# Altium footprint library Pi.PcbLib: 61 footprints (part 4 of 4)
Each footprint in its own frame and in the unit in brackets; x right, y up, seen from the top. Pads: shape width x height; smd on the part's side, far side on the other; paste and mask are expansions set on the pad; w line width, h text height; cw(c..) or ccw(c..) is an arc to the next point about the centre after c.
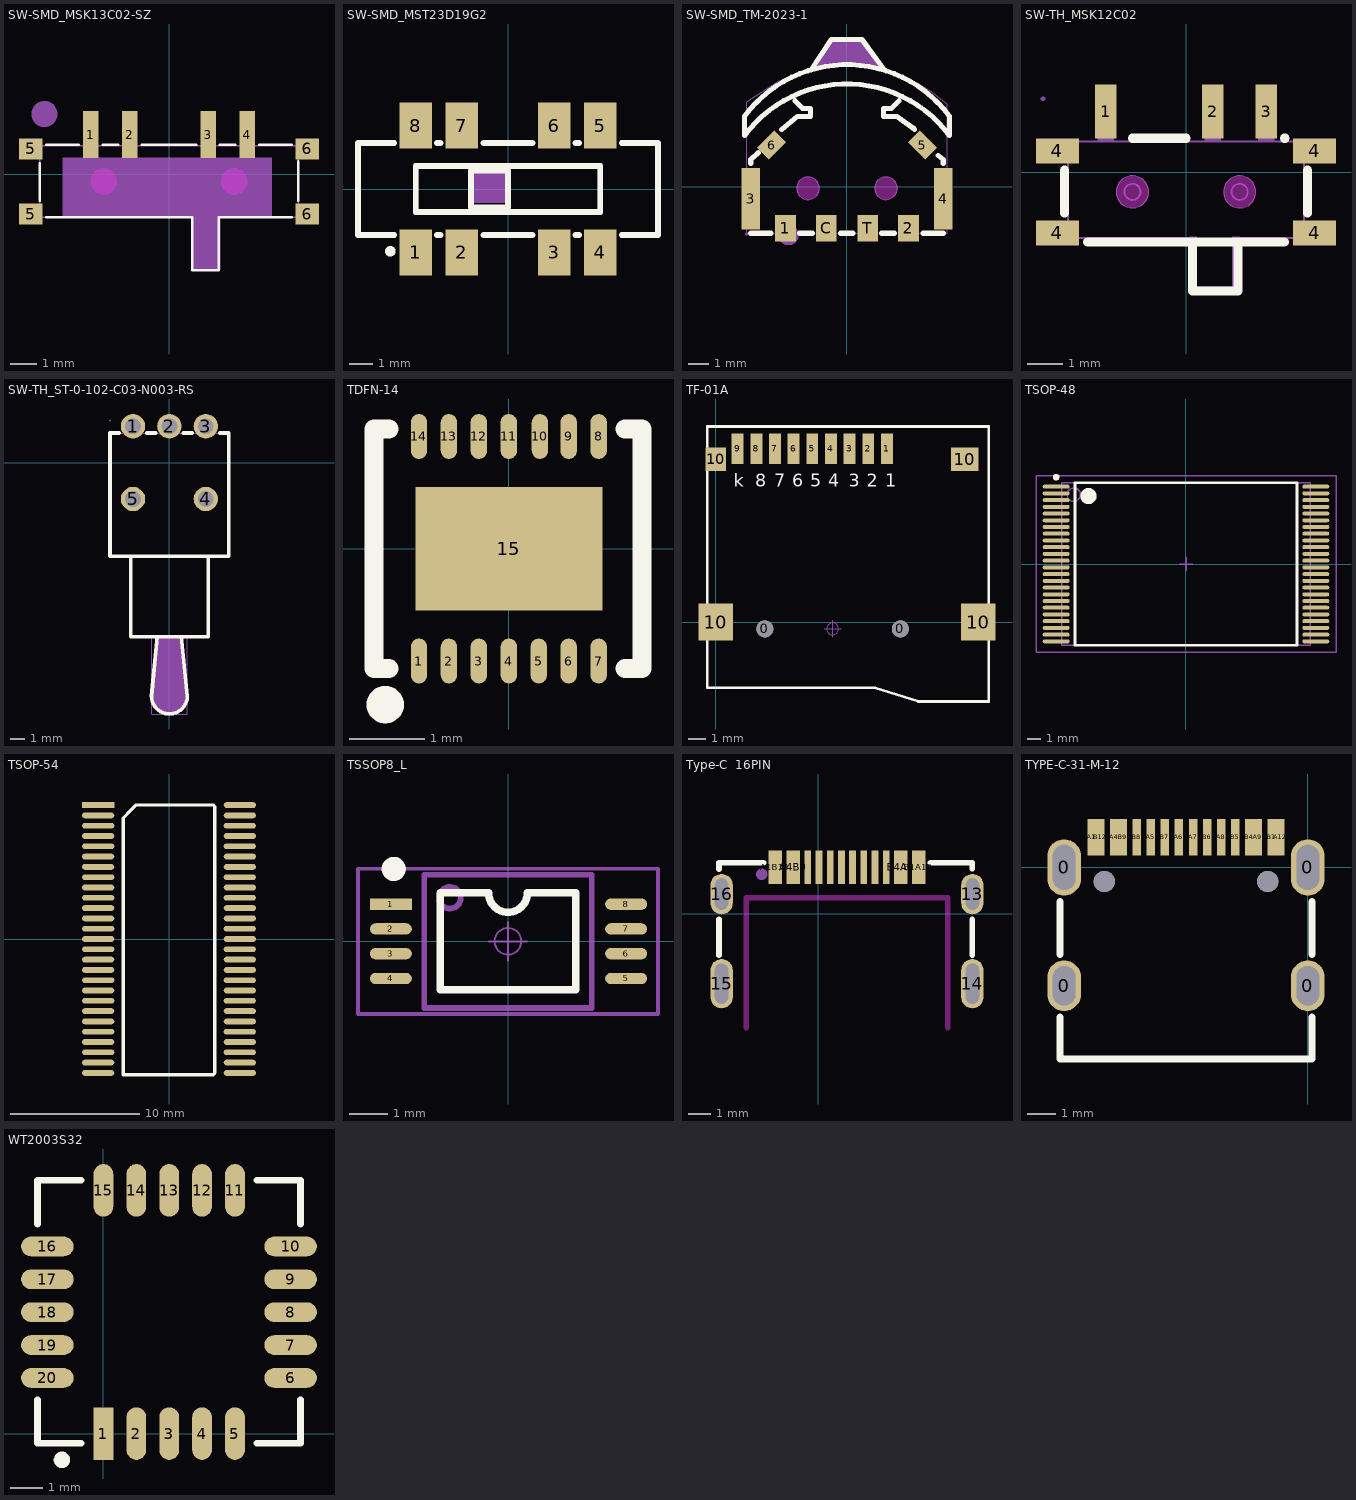
[diagram p3: the footprints below, top view; thin cyan lines are the x and y axes]

## SW-SMD_MSK13C02-SZ [mil]
pads (8):
  rect 23.6x70.9 smd mask+2: 1(-118.1,60.1) 2(-59.1,60.1) 3(59.1,60.1) 4(118.1,60.1)
  rect 35.4x31.5 smd mask+2: 5(-208.7,-60.1) 5(-208.7,38.4) 6(208.7,-60.1) 6(208.7,38.4)
Top Overlay:
  lines w3.9: -195,-40 -195,16.6 ; -184.9,-64.9 -184.9,-65 35,-65 35,-145 75,-145 75,-65 184.9,-65 ; -184.9,45 -136,45 ; -100.2,45 -76.9,45 ; -41.2,45 41.2,45 ; 76.9,45 100.2,45 ; 136,45 184.9,45 ; 195,-40 195,20
Keep-Out Layer:
  board cut-out: -78.7,-10.8 -78.7,-6.88 -81.7,0.36 -87.24,5.9 -94.48,8.9 -102.32,8.9 -109.56,5.9 -115.1,0.36 -118.1,-6.88 -118.1,-10.8 -118.1,-14.72 -115.1,-21.96 -109.56,-27.5 -102.32,-30.5 -94.48,-30.5 -87.24,-27.5 -81.7,-21.96 -78.7,-14.72
  board cut-out: 118.1,-10.8 118.1,-6.88 115.1,0.36 109.56,5.9 102.32,8.9 94.48,8.9 87.24,5.9 81.7,0.36 78.7,-6.88 78.7,-10.8 78.7,-14.72 81.7,-21.96 87.24,-27.5 94.48,-30.5 102.32,-30.5 109.56,-27.5 115.1,-21.96 118.1,-14.72
Mechanical 1:
  circle w0.2: c-98.4,-10.8 r19.7
  circle w0.2: c98.4,-10.8 r19.7
Mechanical 6:
  circle w19.7: c-188,91 r9.8
  region: 35,-145 35,-65 75,-65 75,-145
  region: -160,-65 -160,25 155,25 155,-65 150,-65
Mechanical 15:
  region: -126,84.5 -110.2,84.5 -110.2,33.3 -126,33.3
  region: -66.9,84.5 -51.2,84.5 -51.2,33.3 -66.9,33.3
  region: 51.2,84.5 66.9,84.5 66.9,33.3 51.2,33.3
  region: 110.2,84.5 126,84.5 126,33.3 110.2,33.3
  region: -213.9,43.4 -194.2,43.4 -194.2,27.7 -213.9,27.7
  region: 194.1,42.7 213.8,42.7 213.8,27 194.1,27
  region: 194.2,-48.2 213.9,-48.2 213.9,-64 194.2,-64
  region: -213.9,-48.2 -194.2,-48.2 -194.2,-64 -213.9,-64
  lines w2: -194.9,-65.1 37.1,-65.1 37.1,-143.9 76.7,-143.9 76.7,-65 194.9,-65 194.9,43.4 -194.9,43.4 -194.9,-65.1
3D body "MSK13C02.STEP": height 59.04, standoff -19.7, extent -213.58,-142.35 213.58,86

## SW-SMD_MST23D19G2 [mm]
pads (8):
  rect 1.4x2 smd: 1(-4,-2.75) 2(-2,-2.75) 3(2,-2.75) 4(4,-2.75) 5(4,2.75) 6(2,2.75) 7(-2,2.75) 8(-4,2.75)
Top Overlay:
  circle w0.254: c-5.1,-2.7 r0.1
  lines w0.254: -4.931,-2 -6.5,-2 -6.5,2 -4.931,2 ; -3.069,-2 -2.931,-2 ; -3.069,2 -2.931,2 ; -1.069,-2 1.069,-2 ; -1.069,2 1.069,2 ; 2.931,-2 3.069,-2 ; 2.931,2 3.069,2 ; 4.931,-2 6.5,-2 6.5,2 4.931,2 ; -4,-1 4,-1 4,1 -4,1 -4,-1 ; -1.6,-0.8 0,-0.8 0,0.8 -1.6,0.8 -1.6,-0.8
Mechanical 15:
  region: -4.1,1.1 -4.1,-1.1 -3.9,-1.1 -3.9,1.1
  region: -3.9,1.1 4.1,1.1 4.1,0.9 -3.9,0.9
  region: 3.9,-1.1 -4.1,-1.1 -4.1,-0.9 3.9,-0.9
  region: 4.1,-1.1 4.1,1.1 3.9,1.1 3.9,-1.1
  region: -1.7,0.7 -1.7,-0.6 -0.1,-0.6 -0.1,0.7

## SW-SMD_TM-2023-1 [mil]
pads (8):
  rect 39.4x51.2 smd mask+2: 1(-118.1,-79.9) 2(118.1,-79.9) C(-39.4,-79.9) T(39.4,-79.9)
  rect 35.4x118.1 smd mask+2: 3(-185,-22.8) 4(185,-22.8)
  rect 47.2x31.5 smd rot 135 mask+2: 5(144.9,79.9)
  rect 47.2x31.5 smd rot 45 mask+2: 6(-144.9,79.9)
Top Overlay:
  lines w9.8: -196.9,97.9 -196.9,134.4 ; -196.83,97.9 cw(c0.02,-47.74) 196.87,97.9 ; -196.85,135.07 cw(c0,-10.57) 196.85,135.07 ; 69,227.9 28.5,282.9 -30.5,282.9 ; 196.9,97.9 196.9,135.1 ; -30.5,282.9 -69,224.2 -30.5,282.9
  lines w10: -185,-89.7 -145.7,-89.7 ; -185,45 -185,52.2 -170,65 ; -125.1,109.9 -95.1,134.9 -70.1,134.9 -70.1,149.9 -85.1,149.9 -100.1,164.9 ; -90.6,-89.7 -66.9,-89.7 ; -11.8,-89.7 11.8,-89.7 ; 66.9,-89.7 90.6,-89.7 ; 99.9,164.9 84.9,149.9 69.9,149.9 69.9,134.9 94.9,134.9 129.9,109.9 ; 145.7,-89.7 185,-89.7 ; 175,60 185,52.2 185,45
Keep-Out Layer:
  board cut-out: 96.5,-3.2 96.5,1.12 93.2,9.09 87.09,15.2 79.12,18.5 70.48,18.5 62.51,15.2 56.4,9.09 53.1,1.12 53.1,-3.2 53.1,-7.52 56.4,-15.49 62.51,-21.6 70.48,-24.9 79.12,-24.9 87.09,-21.6 93.2,-15.49 96.5,-7.52
  board cut-out: -53.1,-3.2 -53.1,1.12 -56.4,9.09 -62.51,15.2 -70.48,18.5 -79.12,18.5 -87.09,15.2 -93.2,9.09 -96.5,1.12 -96.5,-3.2 -96.5,-7.52 -93.2,-15.49 -87.09,-21.6 -79.12,-24.9 -70.48,-24.9 -62.51,-21.6 -56.4,-15.49 -53.1,-7.52
Mechanical 1:
  circle w0.2: c74.8,-3.2 r21.7
  circle w0.2: c-74.8,-3.2 r21.7
Mechanical 6:
  circle w19.7: c-112.6,-92.9 r9.8
  region: -63.8,226.8 -0.8,234.6 61.4,226.8 32.3,283.5 -32.3,283.5
Mechanical 15:
  region: 105.3,-63 130.9,-63 130.9,-90.5 105.3,-90.5
  region: 26.6,-63 52.2,-63 52.2,-90.5 26.6,-90.5
  region: -52.2,-63 -26.6,-63 -26.6,-90.5 -52.2,-90.5
  region: -130.9,-63 -105.3,-63 -105.3,-90.5 -130.9,-90.5
  region: 181.1,26.4 192.9,26.4 192.9,-72.1 181.1,-72.1
  region: -192.9,26.4 -181.1,26.4 -181.1,-72.1 -192.9,-72.1
  region: 147.7,68.8 133.7,82.7 142.1,91.1 156,77.1
  region: -156,77.1 -142.1,91.1 -133.7,82.7 -147.7,68.8
  region: -190.5,-90.5 -190.5,-89.51 -191.91,-88.1 -193.89,-88.1 -195.3,-89.51 -195.3,-90.5 -195.3,-91.49 -193.89,-92.9 -191.91,-92.9 -190.5,-91.49
  lines w2: -192.9,-90.5 -192.9,163 -129.9,203.2 -95.3,217.3 -58.3,229.1 -32.3,283.5 0,283.5 31.5,283.5 59.8,229.1 96.8,216.5 133.1,200.8 163.8,181.1 192.9,158.3 192.1,-89.8 -192.9,-90.5
3D body "TM-2023.STEP": height 88.56, standoff -21.67, extent -191.89,-97 193.89,280.6

## SW-TH_MSK12C02 [mil]
pads (7):
  rect 23.6x60 smd mask+2: 1(-88.6,66.9) 2(29.5,66.9) 3(88.6,66.9)
  rect 47.2x27.6 smd mask+2: 4(-141.7,-66.9) 4(-141.7,23.6) 4(141.7,-66.9) 4(141.7,23.6)
Top Overlay:
  lines w10: -133.9,-45 -133.9,2.2 ; -108.3,-76.8 108.3,-76.8 ; -59.1,37.4 0,37.4 ; 7,-78 7,-131 57.2,-131 57.2,-77 ; 108.6,37.4 109,37.4 ; 133.9,-45 133.9,2.2
Keep-Out Layer:
  board cut-out: -41.3,-21.7 -41.3,-18.18 -43.99,-11.67 -48.97,-6.69 -55.48,-4 -62.52,-4 -69.03,-6.69 -74.01,-11.67 -76.7,-18.18 -76.7,-21.7 -76.7,-25.22 -74.01,-31.73 -69.03,-36.71 -62.52,-39.4 -55.48,-39.4 -48.97,-36.71 -43.99,-31.73 -41.3,-25.22
  board cut-out: 76.8,-21.7 76.8,-18.18 74.11,-11.67 69.13,-6.69 62.62,-4 55.58,-4 49.07,-6.69 44.09,-11.67 41.4,-18.18 41.4,-21.7 41.4,-25.22 44.09,-31.73 49.07,-36.71 55.58,-39.4 62.62,-39.4 69.13,-36.71 74.11,-31.73 76.8,-25.22
Mechanical 1:
  circle w0.2: c-59,-21.7 r17.7
  circle w0.2: c59.1,-21.7 r17.7
Mechanical 6:
  region: 3.9,-76.8 3.9,-133.9 59.1,-133.9 59.1,-70.9 51.2,-70.9 51.2,-126 11.8,-126 11.8,-70.9 3.9,-70.9
Mechanical 15:
  circle w2: c-59,-21.7 r8.9
  circle w2: c59.1,-21.7 r8.9
  region: -155.1,80.9 -155.1,81.89 -156.51,83.3 -158.49,83.3 -159.9,81.89 -159.9,80.9 -159.9,79.91 -158.49,78.5 -156.51,78.5 -155.1,79.91
  region: -128,14.8 -157.5,14.8 -157.5,32.5 -128,32.5
  region: -128,-72.1 -157.5,-72.1 -157.5,-54.4 -128,-54.4
  region: 157.5,14.8 127.9,14.8 127.9,32.5 157.5,32.5
  region: 157.5,-72.1 128,-72.1 128,-54.4 157.5,-54.4
  region: -97.4,33.3 -97.4,42 -79.7,42 -79.7,33.3
  region: -97.4,41.6 -97.4,80.9 -79.7,80.9 -79.7,41.6
  region: 20.7,33.3 20.7,42 38.4,42 38.4,33.3
  region: 20.7,41.6 20.7,80.9 38.4,80.9 38.4,41.6
  region: 79.7,33.3 79.7,42 97.4,42 97.4,33.3
  region: 79.7,41.6 79.7,80.9 97.4,80.9 97.4,41.6
  lines w2: -129.9,-72.6 3.9,-72.6 3.9,-131.7 31.5,-131.7 59.1,-131.7 59.1,-72.6 129.9,-72.6 129.9,33.7 -129.9,33.7 -129.9,-72.6
3D body "MSK12C02.STEP": height 59.03, standoff -19.7, extent -153.52,-132.7 153.52,72

## SW-TH_ST-0-102-C03-N003-RS [mm]
pads (5):
  round 1.7 hole 1.1 mask+0.051: 1(-2.54,2.54) 2(0,2.54) 3(2.54,2.54) 4(2.54,-2.54) 5(-2.54,-2.54)
Top Overlay:
  lines w0.254: -3.508,2.06 -4.15,2.06 -4.15,-6.54 4.15,-6.54 4.15,2.06 3.508,2.06 ; -2.7,-6.54 -2.7,-12.14 2.7,-12.14 2.7,-6.54 ; -1.572,2.06 -0.968,2.06 ; -0.838,-12.14 -1.25,-16.292 ccw(c0,-16.286) 1.25,-16.291 0.832,-12.14 ; 0.968,2.06 1.572,2.06
Mechanical 6:
  region: -1.249,-16.292 -1.249,-16.456 -1.162,-16.772 -0.997,-17.056 -0.765,-17.287 -0.48,-17.451 -0.163,-17.535 0.165,-17.535 0.482,-17.45 0.766,-17.287 0.999,-17.055 1.164,-16.771 1.25,-16.455 1.25,-16.291 0.86,-12.13 -0.81,-12.11
Mechanical 15:
  region: -4.09,2.94 -4.09,2.965 -4.125,3 -4.175,3 -4.21,2.965 -4.21,2.94 -4.21,2.915 -4.175,2.88 -4.125,2.88 -4.09,2.915
  region: -2.79,-2.34 -2.29,-2.34 -2.29,-2.74 -2.79,-2.74
  region: 2.29,-2.34 2.79,-2.34 2.79,-2.74 2.29,-2.74
  region: 2.29,2.94 2.79,2.94 2.79,2.14 2.29,2.14
  region: -0.25,2.94 0.25,2.94 0.25,2.14 -0.25,2.14
  region: -2.79,2.94 -2.29,2.94 -2.29,2.14 -2.79,2.14
  region: 2.79,2.94 2.29,2.94 2.29,2.05 2.79,2.05
  region: 0.25,2.94 -0.25,2.94 -0.25,2.05 0.25,2.05
  region: -2.29,2.94 -2.79,2.94 -2.79,2.05 -2.29,2.05
  lines w0.051: -4.15,-6.54 -2.7,-6.54 -2.7,-12.14 -1.25,-12.14 -1.25,-17.54 1.25,-17.54 1.25,-12.14 2.7,-12.14 2.7,-6.54 4.15,-6.54 4.15,2.06 -4.15,2.06 -4.15,-6.54
3D body "SW-TH_ST-0-102-C03-N003-RS.STEP": height 5.71, standoff -3.6, extent -4.175,-17.649 4.125,3.251

## TDFN-14 [mm]
pads (15):
  oval 0.22x0.6 smd: 1(-1.2,-1.5) 2(-0.8,-1.5) 3(-0.4,-1.5) 4(0.001,-1.5) 5(0.4,-1.5) 6(0.8,-1.5) 7(1.2,-1.5) 8(1.2,1.5) 9(0.8,1.5) 10(0.416,1.5) 11(0,1.5) 12(-0.4,1.5) 13(-0.8,1.5) 14(-1.2,1.5)
  rect 2.5x1.65 smd: 15(0,0)
Top Overlay:
  lines w0.25: -1.652,-1.958 ccw(c-1.651,-2.083) -1.65,-1.958
  lines w0.254: -1.6,-1.6 -1.8,-1.6 -1.8,1.6 -1.6,1.6 ; 1.549,-1.6 1.778,-1.6 1.778,1.6 1.549,1.6

## TF-01A [mm] "TF-01A"
pads (15):
  round 1 hole 1 unplated: 0(2.9,-0.4) 0(10.9,-0.4)
  rect 0.7x1.8 smd: 1(10.1,10.227) 2(9,10.227) 3(7.9,10.227) 4(6.8,10.227) 5(5.7,10.227) 6(4.6,10.227) 7(3.5,10.227) 8(2.4,10.227) 9(1.3,10.227)
  rect 2.032x2.2 smd: 10(0,0) 10(15.5,0)
  rect 1.2x1.4 smd: 10(0,9.6)
  rect 1.6x1.4 smd: 10(14.7,9.6)
Top Overlay:
  lines w0.152: 9.389,-3.87 11.954,-4.683 16.104,-4.683 16.104,11.538 -0.502,11.538 -0.502,-3.87 9.414,-3.87
  text "1" at 9.998,7.982 h0.76
  text "2" at 8.906,7.982 h0.76
  text "3" at 7.839,7.982 h0.76
  text "4" at 6.646,7.982 h0.76
  text "5" at 5.579,7.982 h0.76
  text "6" at 4.512,7.982 h0.76
  text "7" at 3.445,7.982 h0.76
  text "8" at 2.328,7.982 h0.76
  text "k" at 1.058,7.982 h0.76
Mechanical 15:
  circle w0.05: c6.9,-0.4 r0.35
  lines w0.05: 6.4,-0.4 7.4,-0.4 ; 6.9,-0.9 6.9,0.1
3D body "TF.STEP": height 2, standoff -0.45, extent -0.15,-4.273 15.85,10.977

## TSOP-48 [mm]
pads (48):
  oval 2x0.3 smd: 1(-9.65,5.75) 2(-9.65,5.25) 3(-9.65,4.75) 4(-9.65,4.25) 5(-9.65,3.75) 6(-9.65,3.25) 7(-9.65,2.75) 8(-9.65,2.25) 9(-9.65,1.75) 10(-9.65,1.25) 11(-9.65,0.75) 12(-9.65,0.25) 13(-9.65,-0.25) 14(-9.65,-0.75) 15(-9.65,-1.25) 16(-9.65,-1.75) 17(-9.65,-2.25) 18(-9.65,-2.75) 19(-9.65,-3.25) 20(-9.65,-3.75) 21(-9.65,-4.25) 22(-9.65,-4.75) 23(-9.65,-5.25) 24(-9.65,-5.75) 25(9.65,-5.75) 26(9.65,-5.25) 27(9.65,-4.75) 28(9.65,-4.25) 29(9.65,-3.75) 30(9.65,-3.25) 31(9.65,-2.75) 32(9.65,-2.25) 33(9.65,-1.75) 34(9.65,-1.25) 35(9.65,-0.75) 36(9.65,-0.25) 37(9.65,0.25) 38(9.65,0.75) 39(9.65,1.25) 40(9.65,1.75) 41(9.65,2.25) 42(9.65,2.75) 43(9.65,3.25) 44(9.65,3.75) 45(9.65,4.25) 46(9.65,4.75) 47(9.65,5.25) 48(9.65,5.75)
Top Overlay:
  circle w0.6: c-7.25,5.05 r0.3
  circle w0.25: c-9.65,6.45 r0.125
  lines w0.2: -8.25,-6.05 8.25,-6.05 8.25,6.05 -8.25,6.05 -8.25,-6.05
Mechanical 13:
  circle w0.1: c-8.35,5.15 r0.5
  lines w0.1: -9.25,-6.05 9.25,-6.05 9.25,6.05 -9.25,6.05 -9.25,-6.05
Mechanical 15:
  lines w0.1: -0.5,0 0.5,0 ; 0,-0.5 0,0.5 ; -11.15,-6.55 11.15,-6.55 11.15,6.55 -11.15,6.55 -11.15,-6.55
3D body "User Library-TSOP48.step": height 1.25, standoff -0.01, extent -10.1,-6.05 10,6.05

## TSOP-54 [mm]
pads (54):
  rect 2.5x0.45 smd: 1(-5.5,10.425)
  oval 2.5x0.45 smd: 2(-5.5,9.625) 3(-5.5,8.825) 4(-5.5,8.025) 5(-5.5,7.225) 6(-5.5,6.425) 7(-5.5,5.625) 8(-5.5,4.825) 9(-5.5,4.025) 10(-5.5,3.225) 11(-5.5,2.425) 12(-5.5,1.625) 13(-5.5,0.825) 14(-5.5,0.025) 15(-5.5,-0.775) 16(-5.5,-1.575) 17(-5.5,-2.375) 18(-5.5,-3.175) 19(-5.5,-3.975) 20(-5.5,-4.775) 21(-5.5,-5.575) 22(-5.5,-6.375) 23(-5.5,-7.175) 24(-5.5,-7.975) 25(-5.5,-8.775) 26(-5.5,-9.575) 27(-5.5,-10.375) 28(5.5,-10.375) 29(5.5,-9.575) 30(5.5,-8.775) 31(5.5,-7.975) 32(5.5,-7.175) 33(5.5,-6.375) 34(5.5,-5.575) 35(5.5,-4.775) 36(5.5,-3.975) 37(5.5,-3.175) 38(5.5,-2.375) 39(5.5,-1.575) 40(5.5,-0.775) 41(5.5,0.025) 42(5.5,0.825) 43(5.5,1.625) 44(5.5,2.425) 45(5.5,3.225) 46(5.5,4.025) 47(5.5,4.825) 48(5.5,5.625) 49(5.5,6.425) 50(5.5,7.225) 51(5.5,8.025) 52(5.5,8.825) 53(5.5,9.625) 54(5.5,10.425)
Top Overlay:
  lines w0.254: -3.556,-10.516 3.429,-10.516 3.556,-10.389 3.556,10.312 3.429,10.439 -2.54,10.439 -2.921,10.058 -3.556,9.423 -3.556,-10.516
3D body "TSOP-54.STEP": height 1.3, standoff -0.4, extent -5.779,-11.109 5.981,11.111

## TSSOP8_L [mm] "TSSOP-8_L3.0-W4.4-H1.0-LS6.4-P0.65"
pads (8):
  rect 1.1x0.3 smd: 1(-3.087,0.975)
  oval 1.1x0.3 smd: 2(-3.087,0.325) 3(-3.087,-0.325) 4(-3.087,-0.975) 5(3.087,-0.975) 6(3.087,-0.325) 7(3.087,0.325) 8(3.087,0.975)
Top Overlay:
  circle w0.381: c-3.012,1.9 r0.127
  lines w0.2: -1.79,-1.27 -1.79,1.27 -0.52,1.27 ccw(c-0.012,1.27) 0.496,1.27 1.766,1.27 1.766,-1.27 -1.79,-1.27
Mechanical 13:
  circle w0.15: c-1.536,1.143 r0.284
  lines w0.15: -2.213,-1.75 -2.213,1.75 2.188,1.75 2.188,-1.75 -2.213,-1.75
Mechanical 15:
  circle w0.05: c-0.012,0 r0.35
  lines w0.05: -0.512,0 0.487,0 ; -0.012,-0.5 -0.012,0.5
  lines w0.1: -3.949,-1.905 3.925,-1.905 3.925,1.905 -3.949,1.905 -3.949,-1.905
3D body "tsSOP8-2.STEP": height 1.14, standoff -0.05, extent -3.19,-1.575 3.09,1.425

## Type-C  16PIN [mm]
pads (16):
  oval 1x1.8 hole 0.6 slot 1.4 at 90 deg: 13(6.893,0.866) 16(-4.307,0.866)
  oval 1x2.2 hole 0.6 slot 1.8 at 90 deg: 14(6.893,-3.133) 15(-4.307,-3.133)
  rect 0.6x1.5 smd: A1B12(-1.907,2.067) A4B9(-1.107,2.067) B1A12(4.493,2.067) B4A9(3.693,2.067)
  rect 0.3x1.5 smd: A5(0.043,2.067) A6(1.043,2.067) A7(1.543,2.067) A8(2.543,2.067) B5(3.043,2.067) B6(2.043,2.067) B7(0.543,2.067) B8(-0.457,2.067)
Top Overlay:
  lines w0.254: -4.422,-1.861 -4.422,-0.255 ; -4.422,1.989 -4.422,2.261 -2.438,2.261 ; 5.024,2.261 6.881,2.261 6.881,1.998 ; 6.881,-1.852 6.881,-0.264
Top Paste:
  region: 4.193,2.817 4.793,2.817 4.793,1.317 4.193,1.317
  region: 3.393,2.817 3.993,2.817 3.993,1.317 3.393,1.317
  region: 2.893,2.817 3.193,2.817 3.193,1.317 2.893,1.317
  region: 2.393,2.817 2.693,2.817 2.693,1.317 2.393,1.317
  region: 1.893,2.817 2.193,2.817 2.193,1.317 1.893,1.317
  region: 1.393,2.817 1.693,2.817 1.693,1.317 1.393,1.317
  region: 0.893,2.817 1.193,2.817 1.193,1.317 0.893,1.317
  region: 0.393,2.817 0.693,2.817 0.693,1.317 0.393,1.317
  region: -0.107,2.817 0.193,2.817 0.193,1.317 -0.107,1.317
  region: -0.607,2.817 -0.307,2.817 -0.307,1.317 -0.607,1.317
  region: -1.407,2.817 -0.807,2.817 -0.807,1.317 -1.407,1.317
  region: -2.207,2.817 -1.607,2.817 -1.607,1.317 -2.207,1.317
  region: 6.393,-2.533 6.393,-2.434 6.469,-2.25 6.61,-2.109 6.793,-2.033 6.992,-2.033 7.176,-2.109 7.317,-2.25 7.393,-2.434 7.393,-2.533 7.393,-3.733 7.393,-3.833 7.317,-4.017 7.176,-4.157 6.992,-4.233 6.793,-4.233 6.61,-4.157 6.469,-4.017 6.393,-3.833 6.393,-3.733
  region: 6.393,1.267 6.393,1.366 6.469,1.55 6.61,1.691 6.793,1.767 6.992,1.767 7.176,1.691 7.317,1.55 7.393,1.366 7.393,1.267 7.393,0.467 7.393,0.367 7.317,0.183 7.176,0.043 6.992,-0.033 6.793,-0.033 6.61,0.043 6.469,0.183 6.393,0.367 6.393,0.467
  region: -4.807,-2.533 -4.807,-2.434 -4.731,-2.25 -4.59,-2.109 -4.406,-2.033 -4.207,-2.033 -4.024,-2.109 -3.883,-2.25 -3.807,-2.434 -3.807,-2.533 -3.807,-3.733 -3.807,-3.833 -3.883,-4.017 -4.024,-4.157 -4.207,-4.233 -4.406,-4.233 -4.59,-4.157 -4.731,-4.017 -4.807,-3.833 -4.807,-3.733
  region: -4.807,1.267 -4.807,1.366 -4.731,1.55 -4.59,1.691 -4.406,1.767 -4.207,1.767 -4.024,1.691 -3.883,1.55 -3.807,1.366 -3.807,1.267 -3.807,0.467 -3.807,0.367 -3.883,0.183 -4.024,0.043 -4.207,-0.033 -4.406,-0.033 -4.59,0.043 -4.731,0.183 -4.807,0.367 -4.807,0.467
Keep-Out Layer:
  lines w0.254: -3.207,-5.094 -3.207,0.706 5.793,0.706 5.793,-5.094
Mechanical 15:
  circle w0.254: c-2.517,1.753 r0.127
3D body "TYPE-C-16.STEP": height 2.16, standoff -1, extent -4.475,-5.193 7.065,2.007

## TYPE-C-31-M-12 [mm]
pads (22):
  oval 1.2x1.8 hole 0.8 slot 1.4 at 90 deg: 0(-8.65,-4.2) 0(0,-4.2)
  oval 1.2x2 hole 0.8 slot 1.6 at 90 deg: 0(-8.65,0) 0(0,0)
  rect 0.3x1.3 smd: A1(-7.675,1.068) A4(-6.875,1.068) A5(-5.575,1.068) A6(-4.575,1.068) A7(-4.075,1.068) A8(-3.075,1.068) A9(-1.775,1.068) A12(-0.975,1.069) B1(-1.275,1.069) B4(-2.075,1.068) B5(-2.575,1.068) B6(-3.575,1.068) B7(-5.075,1.068) B8(-6.075,1.068) B9(-6.575,1.068) B12(-7.375,1.068)
  round 0.75 hole 0.75 unplated: ""(-7.225,-0.5) ""(-1.425,-0.5)
Top Overlay:
  lines w0.254: -8.794,-5.318 -8.794,-6.8 0.146,-6.8 0.146,-5.318 ; -8.794,-3.081 -8.794,-1.218 ; 0.146,-3.082 0.146,-1.218
Top Paste:
  drawing of 16 lines, arcs and shapes, not listed
Mechanical 15:
  circle w0.25: c-1.425,-0.5 r0.125
  circle w0.25: c-7.225,-0.5 r0.125
3D body "TYPE-C-31-M-12.STEP": height 3.21, standoff -1.05, extent -8.794,-6.8 0.146,0.95

## WT2003S32 [mm]
pads (20):
  rect 0.6x1.6 smd: 1(0,0)
  oval 0.6x1.6 smd: 2(1,0) 3(2,0) 4(3,0) 5(4,0) 11(4,7.4) 12(3,7.4) 13(2,7.4) 14(1,7.4) 15(0,7.4)
  oval 1.6x0.6 smd: 6(5.693,1.693) 7(5.693,2.693) 8(5.693,3.693) 9(5.693,4.693) 10(5.693,5.693) 16(-1.707,5.693) 17(-1.707,4.693) 18(-1.707,3.693) 19(-1.707,2.693) 20(-1.707,1.693)
Top Overlay:
  lines w0.2: -2.007,1.025 -2.007,-0.3 -0.682,-0.3 ; -2.007,6.375 -2.007,7.7 -0.682,7.7 ; 4.668,-0.3 5.993,-0.3 5.993,1.025 ; 4.668,7.7 5.993,7.7 5.993,6.375
  lines w0.25: -1.389,-0.8 ccw(c-1.264,-0.8) -1.358,-0.718
3D body: height 0.25, standoff 0, extent -2.016,-0.3 5.993,7.7